# Altium footprint library PcbLib1.PcbLib: 49 footprints (part 2 of 4)
Each footprint in its own frame and in the unit in brackets; x right, y up, seen from the top. Pads: shape width x height; smd on the part's side, far side on the other; paste and mask are expansions set on the pad; w line width, h text height; cw(c..) or ccw(c..) is an arc to the next point about the centre after c.
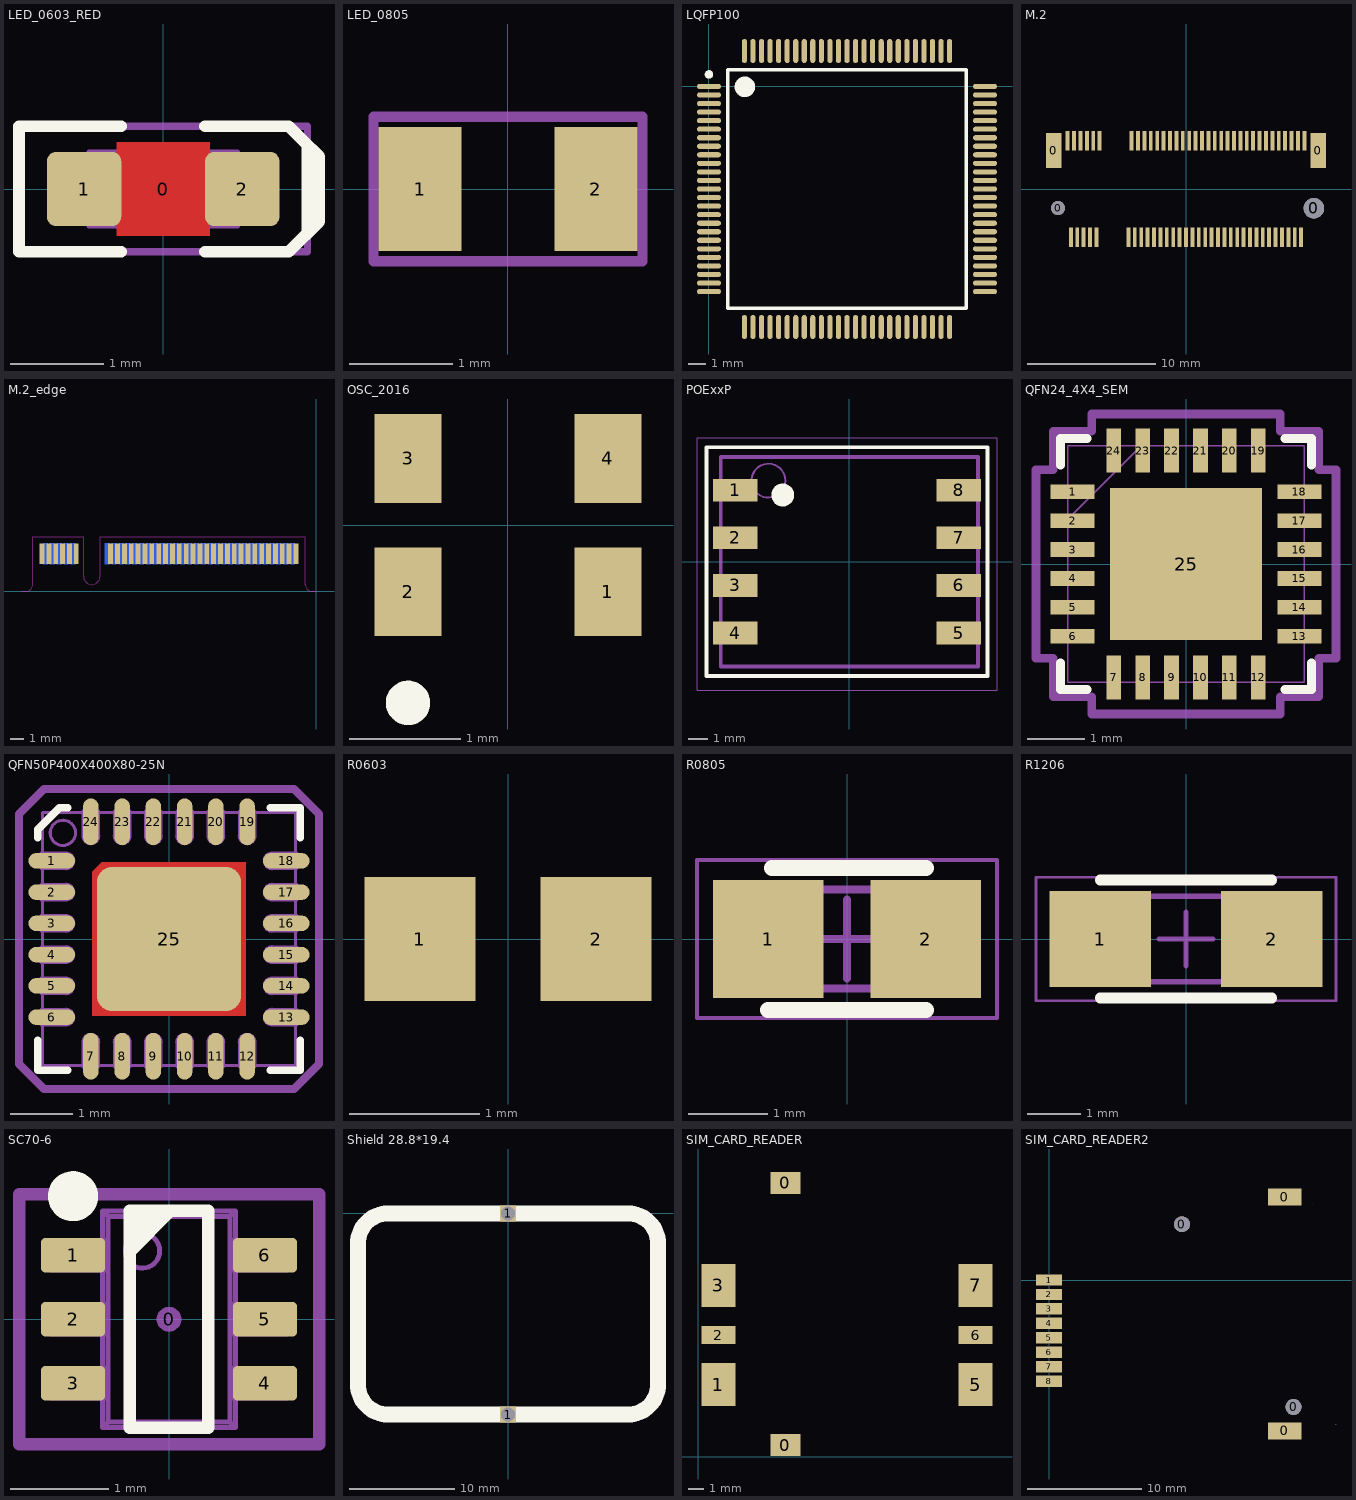
[diagram p1: the footprints below, top view; thin cyan lines are the x and y axes]

## LED_0603_RED [mm]
height 0.8
pads (3):
  round 0.254 on Mech15: 0(0,0)
  rrect25% 0.8x0.8 smd: 1(-0.85,0) 2(0.85,0)
Top Layer:
  pour cut-out: -0.5,0.5 0.5,0.5 0.5,-0.5 -0.5,-0.5
Top Overlay:
  lines w0.127: -0.45,-0.675 -1.55,-0.675 -1.55,0.675 -0.45,0.675 ; 0.45,-0.675 1.35,-0.675 1.55,-0.475 1.55,0.475 1.35,0.675 0.45,0.675 ; 1.5,0.525 1.675,0.35 1.675,-0.35 1.525,-0.5
Mechanical 13:
  lines w0.05: -0.6,-0.4 -0.6,0.399 0.6,0.4 0.6,-0.4 -0.6,-0.399 ; -0.505,-0.398 -0.505,0.398 ; -0.5,-0.4 -0.8,-0.4 -0.8,0.4 -0.5,0.4 ; 0.5,-0.4 0.8,-0.4 0.8,0.4 0.5,0.4 ; 0.505,-0.398 0.505,0.398 ; -0.599,-0.398 -0.599,0.398 0.599,0.398 0.599,-0.398 -0.599,-0.398
Mechanical 15:
  lines w0.076: -1.55,-0.675 1.55,-0.675 1.55,0.675 -1.55,0.675 -1.55,-0.675
3D body "LED 0603 APT1608 RED.STEP": height 0.75, standoff 0, extent -0.8,-0.4 0.8,0.4

## LED_0805 [mm]
pads (2):
  rect 0.8x1.2 smd: 1(-0.85,0) 2(0.85,0)
Mechanical 15:
  lines w0.1: -1.3,-0.7 -1.3,0.7 1.3,0.7 1.3,-0.7 -1.3,-0.7
  text ".Designator" at -1.4,-0.1 h0.5
3D body "LED-0805.step": height 0.9, standoff -0.01, extent -1.05,-0.675 1.05,0.675

## LQFP100 [mm]
pads (100):
  oval 1.4x0.3 smd: 1(0,0) 2(0,-0.5) 3(0,-1) 4(0,-1.5) 5(0,-2) 6(0,-2.5) 7(0,-3) 8(0,-3.5) 9(0,-4) 10(0,-4.5) 11(0,-5) 12(0,-5.5) 13(0,-6) 14(0,-6.5) 15(0,-7) 16(0,-7.5) 17(0,-8) 18(0,-8.5) 19(0,-9) 20(0,-9.5) 21(0,-10) 22(0,-10.5) 23(0,-11) 24(0,-11.5) 25(0,-12) 51(16.15,-12) 52(16.15,-11.5) 53(16.15,-11) 54(16.15,-10.5) 55(16.15,-10) 56(16.15,-9.5) 57(16.15,-9) 58(16.15,-8.5) 59(16.15,-8) 60(16.15,-7.5) 61(16.15,-7) 62(16.15,-6.5) 63(16.15,-6) 64(16.15,-5.5) 65(16.15,-5) 66(16.15,-4.5) 67(16.15,-4) 68(16.15,-3.5) 69(16.15,-3) 70(16.15,-2.5) 71(16.15,-2) 72(16.15,-1.5) 73(16.15,-1) 74(16.15,-0.5) 75(16.15,0)
  oval 0.3x1.4 smd: 26(2.075,-14.075) 27(2.575,-14.075) 28(3.075,-14.075) 29(3.575,-14.075) 30(4.075,-14.075) 31(4.575,-14.075) 32(5.075,-14.075) 33(5.575,-14.075) 34(6.075,-14.075) 35(6.575,-14.075) 36(7.075,-14.075) 37(7.575,-14.075) 38(8.075,-14.075) 39(8.575,-14.075) 40(9.075,-14.075) 41(9.575,-14.075) 42(10.075,-14.075) 43(10.575,-14.075) 44(11.075,-14.075) 45(11.575,-14.075) 46(12.075,-14.075) 47(12.575,-14.075) 48(13.075,-14.075) 49(13.575,-14.075) 50(14.075,-14.075) 76(14.075,2.075) 77(13.575,2.075) 78(13.075,2.075) 79(12.575,2.075) 80(12.075,2.075) 81(11.575,2.075) 82(11.075,2.075) 83(10.575,2.075) 84(10.075,2.075) 85(9.575,2.075) 86(9.075,2.075) 87(8.575,2.075) 88(8.075,2.075) 89(7.575,2.075) 90(7.075,2.075) 91(6.575,2.075) 92(6.075,2.075) 93(5.575,2.075) 94(5.075,2.075) 95(4.575,2.075) 96(4.075,2.075) 97(3.575,2.075) 98(3.075,2.075) 99(2.575,2.075) 100(2.075,2.075)
Top Overlay:
  circle w0.6: c2.1,-0.025 r0.3
  circle w0.25: c0,0.7 r0.125
  lines w0.2: 1.1,-12.975 15.05,-12.975 15.05,0.975 1.1,0.975 1.1,-12.975
Mechanical 13:
  lines w0.1: 1.075,-13 15.075,-13 15.075,1 1.075,1 1.075,-13
3D body "LQFP100_05.step": height 1.6, standoff 0, extent 0.075,-14 16.075,2

## M.2 [mm]
pads (71):
  rect 1.2x2.75 smd: 0(-10.35,3) 0(10.35,3)
  round 1.1 hole 1.1 unplated: 0(-10,-1.5)
  round 1.6 hole 1.6 unplated: 0(10,-1.5)
  rect 0.3x1.55 smd: 1(-9.25,3.775) 2(-8.75,3.775) 3(-8.25,3.775) 4(-7.75,3.775) 5(-7.25,3.775) 6(-6.75,3.775) 7(-4.25,3.775) 8(-3.75,3.775) 9(-3.25,3.775) 10(-2.75,3.775) 11(-2.25,3.775) 12(-1.75,3.775) 13(-1.25,3.775) 14(-0.75,3.775) 15(-0.25,3.775) 16(0.25,3.775) 17(0.75,3.775) 18(1.25,3.775) 19(1.75,3.775) 20(2.25,3.775) 21(2.75,3.775) 22(3.25,3.775) 23(3.75,3.775) 24(4.25,3.775) 25(4.75,3.775) 26(5.25,3.775) 27(5.75,3.775) 28(6.25,3.775) 29(6.75,3.775) 30(7.25,3.775) 31(7.75,3.775) 32(8.25,3.775) 33(8.75,3.775) 34(9.25,3.775) 35(9,-3.775) 36(8.5,-3.775) 37(8,-3.775) 38(7.5,-3.775) 39(7,-3.775) 40(6.5,-3.775) 41(6,-3.775) 42(5.5,-3.775) 43(5,-3.775) 44(4.5,-3.775) 45(4,-3.775) 46(3.5,-3.775) 47(3,-3.775) 48(2.5,-3.775) 49(2,-3.775) 50(1.5,-3.775) 51(1,-3.775) 52(0.5,-3.775) 53(0,-3.775) 54(-0.5,-3.775) 55(-1,-3.775) 56(-1.5,-3.775) 57(-2,-3.775) 58(-2.5,-3.775) 59(-3,-3.775) 60(-3.5,-3.775) 61(-4,-3.775) 62(-4.5,-3.775) 63(-7,-3.775) 64(-7.5,-3.775) 65(-8,-3.775) 66(-8.5,-3.775) 67(-9,-3.775)
3D body "M_2.stp": height 4.09, standoff -0.62, extent -10.95,-4.3 10.95,4.4

## M.2_edge [mm]
pads (67):
  rect 0.35x1.5 smd: 1(-19.975,2.75) 2(-19.475,2.75) 3(-18.975,2.75) 4(-18.475,2.75) 5(-17.975,2.75) 6(-17.475,2.75) 7(-14.975,2.75) 8(-14.475,2.75) 9(-13.975,2.75) 10(-13.475,2.75) 11(-12.975,2.75) 12(-12.475,2.75) 13(-11.975,2.75) 14(-11.475,2.75) 15(-10.975,2.75) 16(-10.475,2.75) 17(-9.975,2.75) 18(-9.475,2.75) 19(-8.975,2.75) 20(-8.475,2.75) 21(-7.975,2.75) 22(-7.475,2.75) 23(-6.975,2.75) 24(-6.475,2.75) 25(-5.975,2.75) 26(-5.475,2.75) 27(-4.975,2.75) 28(-4.475,2.75) 29(-3.975,2.75) 30(-3.475,2.75) 31(-2.975,2.75) 32(-2.475,2.75) 33(-1.975,2.75) 34(-1.475,2.75)
  rect 0.35x1.5 smd far side: 35(-1.725,2.75) 36(-2.225,2.75) 37(-2.725,2.75) 38(-3.225,2.75) 39(-3.725,2.75) 40(-4.225,2.75) 41(-4.725,2.75) 42(-5.225,2.75) 43(-5.725,2.75) 44(-6.225,2.75) 45(-6.725,2.75) 46(-7.225,2.75) 47(-7.725,2.75) 48(-8.225,2.75) 49(-8.725,2.75) 50(-9.225,2.75) 51(-9.725,2.75) 52(-10.225,2.75) 53(-10.725,2.75) 54(-11.225,2.75) 55(-11.725,2.75) 56(-12.225,2.75) 57(-12.725,2.75) 58(-13.225,2.75) 59(-13.725,2.75) 60(-14.225,2.75) 61(-14.725,2.75) 62(-15.225,2.75) 63(-17.725,2.75) 64(-18.225,2.75) 65(-18.725,2.75) 66(-19.225,2.75) 67(-19.725,2.75)
Top Solder:
  region: -15.75,4 -15.75,1.375 -0.8,1.375 -0.8,4
  region: -20.65,4 -20.65,1.375 -16.95,1.375 -16.95,4
Bottom Solder:
  region: -15.75,4 -15.75,1.375 -0.8,1.375 -0.8,4
  region: -20.65,4 -20.65,1.375 -16.95,1.375 -16.95,4
Keep-Out Layer:
  lines w0.05: -21.45,0 -21.15,0 ccw(c-21.15,0.5) -20.65,0.5 -20.65,4 -16.95,4 -16.95,1.1 ccw(c-16.35,1.1) -15.75,1.1 -15.75,4 -0.8,4 -0.8,0.5 ccw(c-0.3,0.5) -0.3,0 0,0

## OSC_2016 [mm]
pads (4):
  rect 0.6x0.8 smd: 1(0.9,-0.6) 2(-0.9,-0.6) 3(-0.9,0.6) 4(0.9,0.6)
Top Overlay:
  circle w0.2: c-0.9,-1.6 r0.1
3D body "NT2016SA-END4910A-48MHZ Crystal (NDK).step": height 0.7, standoff 0, extent -1,-0.8 1,0.8

## POExxP [mm]
height 10
pads (8):
  rect 2.335x1.19 smd: 1(-6,3.75) 2(-6,1.25) 3(-6,-1.25) 4(-6,-3.75) 5(5.75,-3.75) 6(5.75,-1.25) 7(5.75,1.25) 8(5.75,3.75)
Top Overlay:
  circle w0.6: c-3.5,3.5 r0.3
  lines w0.2: -7.5,-6 7.25,-6 7.25,6 -7.5,6 -7.5,-6
Mechanical 13:
  circle w0.1: c-4.25,4.25 r0.889
  lines w0.2: -6.75,-5.5 6.75,-5.5 6.75,5.5 -6.75,5.5 -6.75,-5.5
Mechanical 15:
  lines w0.05: -8,-6.75 7.75,-6.75 7.75,6.5 -8,6.5 -8,-6.75
3D body "Coilcraft-POE30P-50L.step": height 8.77, standoff -0.25, extent -6.6,-5.46 6.6,5.46

## QFN24_4X4_SEM [mm]
pads (25):
  rect 0.757x0.255 smd paste+0 mask+0: 1(-1.966,1.25) 2(-1.966,0.75) 3(-1.966,0.25) 4(-1.966,-0.25) 5(-1.966,-0.75) 6(-1.966,-1.25) 13(1.966,-1.25) 14(1.966,-0.75) 15(1.966,-0.25) 16(1.966,0.25) 17(1.966,0.75) 18(1.966,1.25)
  rect 0.255x0.757 smd paste+0 mask+0: 7(-1.25,-1.966) 8(-0.75,-1.966) 9(-0.25,-1.966) 10(0.25,-1.966) 11(0.75,-1.966) 12(1.25,-1.966) 19(1.25,1.966) 20(0.75,1.966) 21(0.25,1.966) 22(-0.25,1.966) 23(-0.75,1.966) 24(-1.25,1.966)
  rect 2.642x2.642 smd paste-1.308 mask+0: 25(0,0)
Top Overlay:
  lines w0.152: -2.172,-1.71 -2.172,-2.172 -1.71,-2.172 ; -2.172,1.71 -2.172,2.172 -1.71,2.172 ; 1.71,-2.172 2.172,-2.172 2.172,-1.71 ; 1.71,2.172 2.172,2.172 2.172,1.71
  text "." at -2.93,2 h0.05
Top Paste:
  region: -0.1,1.221 -1.221,1.221 -1.221,0.1 -0.1,0.1
  region: -0.1,-0.1 -1.221,-0.1 -1.221,-1.221 -0.1,-1.221
  region: 1.221,1.221 0.1,1.221 0.1,0.1 1.221,0.1
  region: 1.221,-0.1 0.1,-0.1 0.1,-1.221 1.221,-1.221
Mechanical 13:
  lines w0.025: -2.045,0.775 -0.775,2.045 ; -2.045,-2.045 2.045,-2.045 2.045,2.045 -2.045,2.045 -2.045,-2.045 ; -2.045,-1.402 -2.045,-1.098 -2.045,-1.402 ; -2.045,-0.902 -2.045,-0.598 -2.045,-0.902 ; -2.045,-0.402 -2.045,-0.098 -2.045,-0.402 ; -2.045,0.098 -2.045,0.402 -2.045,0.098 ; -2.045,0.598 -2.045,0.902 -2.045,0.598 ; -2.045,1.098 -2.045,1.402 -2.045,1.098 ; -1.402,-2.045 -1.098,-2.045 -1.402,-2.045 ; -1.402,2.045 -1.098,2.045 -1.402,2.045 ; -0.902,-2.045 -0.598,-2.045 -0.902,-2.045 ; -0.902,2.045 -0.598,2.045 -0.902,2.045 ; -0.402,-2.045 -0.098,-2.045 -0.402,-2.045 ; -0.402,2.045 -0.098,2.045 -0.402,2.045 ; 0.098,-2.045 0.402,-2.045 0.098,-2.045 ; 0.098,2.045 0.402,2.045 0.098,2.045 ; 0.598,-2.045 0.902,-2.045 0.598,-2.045 ; 0.598,2.045 0.902,2.045 0.598,2.045 ; 1.098,-2.045 1.402,-2.045 1.098,-2.045 ; 1.098,2.045 1.402,2.045 1.098,2.045 ; 2.045,-1.402 2.045,-1.098 2.045,-1.402 ; 2.045,-0.902 2.045,-0.598 2.045,-0.902 ; 2.045,-0.402 2.045,-0.098 2.045,-0.402 ; 2.045,0.098 2.045,0.402 2.045,0.098 ; 2.045,0.598 2.045,0.902 2.045,0.598 ; 2.045,1.098 2.045,1.402 2.045,1.098
  text "." at -1.605,1.65 h0.05
Mechanical 15:
  lines w0.152: -2.599,-1.631 -2.299,-1.631 -2.299,-2.299 -1.631,-2.299 -1.631,-2.599 1.631,-2.599 1.631,-2.299 2.299,-2.299 2.299,-1.631 2.599,-1.631 2.599,1.631 2.299,1.631 2.299,2.299 1.631,2.299 1.631,2.599 -1.631,2.599 -1.631,2.299 -2.299,2.299 -2.299,1.631 -2.599,1.631 -2.599,-1.631
3D body "QFN24_4X4_SEM.step": height 0.99, standoff 0, extent -2.045,-2.045 2.045,2.045
3D body: height 0.25, standoff 0, extent 0,0 0.254,0.254

## QFN50P400X400X80-25N [mm] "QFN, 24-Leads with exposed die pad, Body 4.05x4.05mm (max), Pitch 0.50mm, IPC Medium Density"
height 0.8
pads (25):
  oval 0.75x0.25 smd mask+0.075: 1(-1.875,1.25) 2(-1.875,0.75) 3(-1.875,0.25) 4(-1.875,-0.25) 5(-1.875,-0.75) 6(-1.875,-1.25) 13(1.875,-1.25) 14(1.875,-0.75) 15(1.875,-0.25) 16(1.875,0.25) 17(1.875,0.75) 18(1.875,1.25)
  oval 0.25x0.75 smd mask+0.075: 7(-1.25,-1.875) 8(-0.75,-1.875) 9(-0.25,-1.875) 10(0.25,-1.875) 11(0.75,-1.875) 12(1.25,-1.875) 19(1.25,1.875) 20(0.75,1.875) 21(0.25,1.875) 22(-0.25,1.875) 23(-0.75,1.875) 24(-1.25,1.875)
  rrect20% 2.3x2.3 smd paste-1.7: 25(0,0)
Top Layer:
  region: -1.075,1.225 -1.225,1.075 -1.225,-1.225 -1.075,-1.225
  region: -1.225,1.075 -1.075,1.225 1.225,1.225 1.225,1.075
  region: 1.225,-1.225 1.225,-1.025 -1.225,-1.025 -1.225,-1.225
  region: 1.025,-1.225 1.225,-1.225 1.225,1.225 1.025,1.225
Top Overlay:
  lines w0.127: -2.1,-1.625 -2.1,-2.1 -1.625,-2.1 ; -2.1,1.625 -2.1,1.75 -1.75,2.1 -1.625,2.1 ; 1.625,-2.1 2.1,-2.1 2.1,-1.625 ; 1.625,2.1 2.1,2.1 2.1,1.625
  text "." at -2.63,1.25 h0.05
Mechanical 13:
  circle w0.05: c-1.698,1.698 r0.202
  lines w0.05: -2.025,-1.375 -2.025,-2.025 -1.375,-2.025 ; -2.025,-1.125 -2.025,-0.875 ; -2.025,-0.625 -2.025,-0.375 ; -2.025,-0.125 -2.025,0.125 ; -2.025,0.375 -2.025,0.625 ; -2.025,0.875 -2.025,1.125 ; -2.025,1.375 -2.025,2.025 -1.375,2.025 ; -1.125,-2.025 -0.875,-2.025 ; -1.125,2.025 -0.875,2.025 ; -0.625,-2.025 -0.375,-2.025 ; -0.625,2.025 -0.375,2.025 ; -0.125,-2.025 0.125,-2.025 ; -0.125,2.025 0.125,2.025 ; 0.375,-2.025 0.625,-2.025 ; 0.375,2.025 0.625,2.025 ; 0.875,-2.025 1.125,-2.025 ; 0.875,2.025 1.125,2.025 ; 1.375,-2.025 2.025,-2.025 2.025,-1.375 ; 1.375,2.025 2.025,2.025 2.025,1.375 ; 2.025,-1.125 2.025,-0.875 ; 2.025,-0.625 2.025,-0.375 ; 2.025,-0.125 2.025,0.125 ; 2.025,0.375 2.025,0.625 ; 2.025,0.875 2.025,1.125 ; -2.045,-1.375 -2.045,-1.125 -1.65,-1.125 cw(c-1.65,-1.25) -1.65,-1.375 -2.045,-1.375 ; -2.045,-0.875 -2.045,-0.625 -1.65,-0.625 cw(c-1.65,-0.75) -1.65,-0.875 -2.045,-0.875 ; -2.045,-0.375 -2.045,-0.125 -1.65,-0.125 cw(c-1.65,-0.25) -1.65,-0.375 -2.045,-0.375 ; -2.045,0.125 -2.045,0.375 -1.65,0.375 cw(c-1.65,0.25) -1.65,0.125 -2.045,0.125 ; -2.045,0.625 -2.045,0.875 -1.65,0.875 cw(c-1.65,0.75) -1.65,0.625 -2.045,0.625 ; -2.045,1.125 -2.045,1.375 -1.65,1.375 cw(c-1.65,1.25) -1.65,1.125 -2.045,1.125 ; -1.375,-2.045 -1.125,-2.045 -1.125,-1.65 ccw(c-1.25,-1.65) -1.375,-1.65 -1.375,-2.045 ; -1.375,1.65 ccw(c-1.25,1.65) -1.125,1.65 -1.125,2.045 -1.375,2.045 -1.375,1.65 ; -0.875,-2.045 -0.625,-2.045 -0.625,-1.65 ccw(c-0.75,-1.65) -0.875,-1.65 -0.875,-2.045 ; -0.875,1.65 ccw(c-0.75,1.65) -0.625,1.65 -0.625,2.045 -0.875,2.045 -0.875,1.65 ; -0.375,-2.045 -0.125,-2.045 -0.125,-1.65 ccw(c-0.25,-1.65) -0.375,-1.65 -0.375,-2.045 ; -0.375,1.65 ccw(c-0.25,1.65) -0.125,1.65 -0.125,2.045 -0.375,2.045 -0.375,1.65 ; 0.125,-2.045 0.375,-2.045 0.375,-1.65 ccw(c0.25,-1.65) 0.125,-1.65 0.125,-2.045 ; 0.125,1.65 ccw(c0.25,1.65) 0.375,1.65 0.375,2.045 0.125,2.045 0.125,1.65 ; 0.625,-2.045 0.875,-2.045 0.875,-1.65 ccw(c0.75,-1.65) 0.625,-1.65 0.625,-2.045 ; 0.625,1.65 ccw(c0.75,1.65) 0.875,1.65 0.875,2.045 0.625,2.045 0.625,1.65 ; 1.125,-2.045 1.375,-2.045 1.375,-1.65 ccw(c1.25,-1.65) 1.125,-1.65 1.125,-2.045 ; 1.125,1.65 ccw(c1.25,1.65) 1.375,1.65 1.375,2.045 1.125,2.045 1.125,1.65 ; 1.65,-1.375 cw(c1.65,-1.25) 1.65,-1.125 2.045,-1.125 2.045,-1.375 1.65,-1.375 ; 1.65,-0.875 cw(c1.65,-0.75) 1.65,-0.625 2.045,-0.625 2.045,-0.875 1.65,-0.875 ; 1.65,-0.375 cw(c1.65,-0.25) 1.65,-0.125 2.045,-0.125 2.045,-0.375 1.65,-0.375 ; 1.65,0.125 cw(c1.65,0.25) 1.65,0.375 2.045,0.375 2.045,0.125 1.65,0.125 ; 1.65,0.625 cw(c1.65,0.75) 1.65,0.875 2.045,0.875 2.045,0.625 1.65,0.625 ; 1.65,1.125 cw(c1.65,1.25) 1.65,1.375 2.045,1.375 2.045,1.125 1.65,1.125
Mechanical 15:
  lines w0.127: -2.4,-2 -2,-2.4 2,-2.4 2.4,-2 2.4,2 2,2.4 -2,2.4 -2.4,2 -2.4,-2
3D body "QFN50P400X400X80-25N.STEP": height 0.8, standoff 0, extent -2.045,-2.045 2.045,2.045

## R0603 [mm]
pads (2):
  rect 0.85x0.95 smd: 1(-0.675,0) 2(0.675,0)
3D body "RES0603.step": height 0.45, standoff 0, extent -0.8,-0.4 0.8,0.4

## R0805 [mm] "Chip Resistor, 2-Leads, Body 2,00x1,25mm, IPC Medium Density"
height 0.65
pads (2):
  rect 1.4x1.5 smd: 1(-1,0) 2(1,0)
Top Overlay:
  lines w0.2: -1,-0.9 1,-0.9 ; -0.95,0.9 1,0.9
Mechanical 13:
  lines w0.1: -1,-0.625 -1,0.625 1,0.625 1,-0.625 -1,-0.625
Mechanical 15:
  lines w0.05: -1.9,-1 -1.9,1 1.9,1 1.9,-1 -1.9,-1
  lines w0.1: -0.5,0 0.5,0 ; 0,-0.5 0,0.5
3D body "Chip Resistor 0805.step": height 0.5, standoff 0, extent -1,-0.6 1,0.6

## R1206 [mm] "Chip Resistor, 2-Leads, Body 3,15x1,60mm, IPC Medium Density"
height 0.7
pads (2):
  rect 1.9x1.8 smd: 1(-1.6,0) 2(1.6,0)
Top Overlay:
  lines w0.2: -1.6,-1.1 1.6,-1.1 ; -1.6,1.1 1.6,1.1
Mechanical 13:
  lines w0.1: -1.6,-0.8 1.6,-0.8 1.6,0.8 -1.6,0.8 -1.6,-0.8
Mechanical 15:
  lines w0.05: -2.8,-1.15 2.8,-1.15 2.8,1.15 -2.8,1.15 -2.8,-1.15
  lines w0.1: -0.5,0 0.5,0 ; 0,-0.5 0,0.5
3D body "Chip Resistor 1206.step": height 0.6, standoff 0, extent -1.6,-0.8 1.6,0.8

## SC70-6 [mm] "SC70-6; SOT-363"
height 1.6
pads (7):
  round 0.254 on Mech15: 0(0,0)
  rrect25% 0.65x0.35 smd mask+0.07: 1(-0.975,0.65) 2(-0.975,0) 3(-0.975,-0.65) 4(0.975,-0.65) 5(0.975,0) 6(0.975,0.65)
Top Overlay:
  circle w0.254: c-0.975,1.25 r0.127
  region: 0.1,1.1 -0.4,0.6 -0.4,1.1
  lines w0.127: -0.4,-1.1 0.4,-1.1 0.4,1.1 -0.4,1.1 -0.4,-1.1
Mechanical 13:
  circle w0.05: c-0.27,0.695 r0.175
  lines w0.05: -1.028,-0.8 -1.028,-0.5 ; -1.028,-0.15 -1.028,0.15 ; -1.028,0.5 -1.028,0.8 ; -0.937,-0.8 -0.937,-0.5 ; -0.937,-0.15 -0.937,0.15 ; -0.937,0.5 -0.937,0.8 ; -0.925,-0.8 -0.925,-0.5 ; -0.925,-0.15 -0.925,0.15 ; -0.925,0.5 -0.925,0.8 ; 0.925,-0.8 0.925,-0.5 ; 0.925,-0.15 0.925,0.15 ; 0.925,0.5 0.925,0.8 ; 0.937,-0.8 0.937,-0.5 ; 0.937,-0.15 0.937,0.15 ; 0.937,0.5 0.937,0.8 ; 1.028,-0.8 1.028,-0.5 ; 1.028,-0.15 1.028,0.15 ; 1.028,0.5 1.028,0.8 ; -0.675,-1.1 -0.619,-1.044 ; -0.675,-1.1 -0.675,1.1 ; -0.675,-1.1 0.675,-1.1 ; -0.675,1.1 -0.619,1.044 ; -0.675,1.1 0.675,1.1 ; -0.619,-1.044 -0.619,1.044 ; -0.619,-1.044 0.619,-1.044 ; -0.619,1.044 0.619,1.044 ; 0.619,-1.044 0.619,1.044 ; 0.619,-1.044 0.675,-1.1 ; 0.619,1.044 0.675,1.1 ; 0.675,-1.1 0.675,1.1 ; -1.2,-0.8 -0.654,-0.8 -0.654,-0.5 -1.2,-0.5 -1.2,-0.8 ; -1.2,-0.15 -0.654,-0.15 -0.654,0.15 -1.2,0.15 -1.2,-0.15 ; -1.2,0.5 -0.654,0.5 -0.654,0.8 -1.2,0.8 -1.2,0.5 ; 0.654,-0.8 0.654,-0.5 1.2,-0.5 1.2,-0.8 0.654,-0.8 ; 0.654,-0.15 0.654,0.15 1.2,0.15 1.2,-0.15 0.654,-0.15 ; 0.654,0.5 0.654,0.8 1.2,0.8 1.2,0.5 0.654,0.5
Mechanical 15:
  lines w0.127: -1.524,-1.27 1.524,-1.27 1.524,1.27 -1.524,1.27 -1.524,-1.27
3D body "SOT363.STEP": height 1.1, standoff 0, extent -1.2,-1.1 1.2,1.1

## Shield 28.8*19.4 [mm] "ms288-10"
pads (2):
  rect 1.5x1.5 hole 1.3: 1(0,-19.1) 1(0,0)
Top Overlay:
  lines w1.5: -14.25,-16.25 ccw(c-11.4,-16.25) -11.4,-19.1 0,-19.1 11.4,-19.1 ccw(c11.4,-16.25) 14.25,-16.25 14.25,-2.85 ccw(c11.4,-2.85) 11.4,0 0,0 -11.4,0 ccw(c-11.4,-2.85) -14.25,-2.85 -14.25,-16.25

## SIM_CARD_READER [mm]
pads (8):
  rect 1.95x1.45 smd: 0(5.69,0.755) 0(5.69,17.885)
  rect 2.2x2.8 smd: 1(1.31,4.705) 3(1.31,11.185) 5(18.11,4.705) 7(18.11,11.185)
  rect 2.2x1.2 smd: 2(1.31,7.945) 6(18.11,7.945)
3D body "SIM1.stp": height 1.9, standoff -0.1, extent 0.2,0.25 25.72,18.35

## SIM_CARD_READER2 [mm]
pads (12):
  round 1.4 hole 1.4 unplated: 0(11.67,4.9) 0(21.47,-11.15)
  rect 2.95x1.5 smd: 0(20.7,-13.26) 0(20.7,7.29)
  rect 2.3x1 smd: 1(0,0) 2(0,-1.27) 3(0,-2.54) 4(0,-3.81) 5(0,-5.08) 6(0,-6.35) 7(0,-7.62) 8(0,-8.89)
Keep-Out Layer:
  lines w0.05: 23.1,6.69 23.1,6.71 ; 25.15,-12.66 25.2,-12.66
3D body "SIM2.stp": height 1.94, standoff -0.56, extent -0.6,-13.375 25.9,7.575